# Altium schematic symbol library jlcpcb_2025_04_capacitors_extended_0402.schlib: 3594 symbols (part 14 of 20)
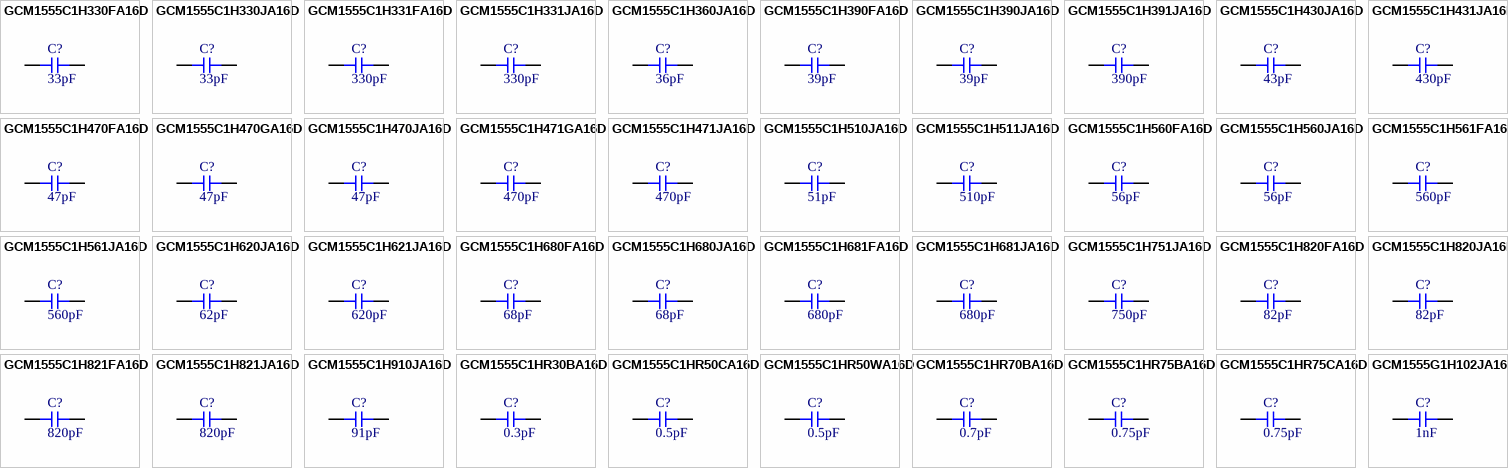
[diagram p102: symbols GCM1555C1H330FA16D to GCM1555G1H102JA16D]

## GCM1555C1H471JA16D
designator C?  Capacitance: 470pF  (hidden comment: *)
Capacitor, Ceramic (MLCC), 470pF, ±5%, 50V, C0G, ±5%, SMD 0402; Manufacturer: Murata Electronics; Manufacturer Part Number: GCM1555C1H471JA16D; Package Size: 0402; JLCPCB Basic Part: No; JLCPCB Part Number: C126512; Supplier 1: LCSC; Category: Capacitors - MLCC; Supplier Part Number 1: C126512; Tolerance: ±5%; Voltage Rating: 50V; Temperature Coefficient: C0G; RoHS: Yes; ComponentLink1Description: Datasheet; ComponentLink1URL: https://wmsc.lcsc.com/wmsc/upload/file/pdf/v2/lcsc/1811081516_Murata-Electronics-GCM1555C1H471JA16D_C126512.pdf; ComponentLink2Description: JLCPCB Part URL; ComponentLink2URL: https://jlcpcb.com/partdetail/C126512; ComponentLink3Description: LCSC Part URL; ComponentLink3URL: https://lcsc.com/product-detail/Multilayer-Ceramic-Capacitors-MLCC---SMD-SMT_Murata-Electronics-Murata-Electronics-GCM1555C1H471JA16D_C126512.html
footprint CAP-0402 (0402 (1005M) Capacitor)
pins: 1, 2

## GCM1555C1H510JA16D
designator C?  Capacitance: 51pF  (hidden comment: *)
Capacitor, Ceramic (MLCC), 51pF, ±5%, 50V, ±5%, SMD 0402; Manufacturer: Murata Electronics; Manufacturer Part Number: GCM1555C1H510JA16D; Package Size: 0402; JLCPCB Basic Part: No; JLCPCB Part Number: C2194843; Supplier 1: LCSC; Category: Capacitors - MLCC; Supplier Part Number 1: C2194843; Tolerance: ±5%; Voltage Rating: 50V; RoHS: Yes; ComponentLink1Description: Datasheet; ComponentLink1URL: https://wmsc.lcsc.com/wmsc/upload/file/pdf/v2/lcsc/2308111722_Murata-Electronics-GCM1555C1H510JA16D_C2194843.pdf; ComponentLink2Description: JLCPCB Part URL; ComponentLink2URL: https://jlcpcb.com/partdetail/C2194843; ComponentLink3Description: LCSC Part URL; ComponentLink3URL: https://lcsc.com/product-detail/Multilayer-Ceramic-Capacitors-MLCC---SMD-SMT_Murata-Electronics-Murata-Electronics-GCM1555C1H510JA16D_C2194843.html
footprint CAP-0402 (0402 (1005M) Capacitor)
pins: 1, 2

## GCM1555C1H511JA16D
designator C?  Capacitance: 510pF  (hidden comment: *)
Capacitor, Ceramic (MLCC), 510pF, 50V, C0G, SMD 0402; Manufacturer: Murata Electronics; Manufacturer Part Number: GCM1555C1H511JA16D; Package Size: 0402; JLCPCB Basic Part: No; JLCPCB Part Number: C2941935; Supplier 1: LCSC; Category: Capacitors - MLCC; Supplier Part Number 1: C2941935; Voltage Rating: 50V; Temperature Coefficient: C0G; RoHS: Yes; ComponentLink1Description: Datasheet; ComponentLink1URL: https://wmsc.lcsc.com/wmsc/upload/file/pdf/v2/lcsc/2201121900_Murata-Electronics-GCM1555C1H511JA16D_C2941935.pdf; ComponentLink2Description: JLCPCB Part URL; ComponentLink2URL: https://jlcpcb.com/partdetail/C2941935; ComponentLink3Description: LCSC Part URL; ComponentLink3URL: https://lcsc.com/product-detail/Multilayer-Ceramic-Capacitors-MLCC---SMD-SMT_Murata-Electronics-Murata-Electronics-GCM1555C1H511JA16D_C2941935.html
footprint CAP-0402 (0402 (1005M) Capacitor)
pins: 1, 2

## GCM1555C1H560FA16D
designator C?  Capacitance: 56pF  (hidden comment: *)
Capacitor, Ceramic (MLCC), 56pF, ±1%, 50V, ±1%, SMD 0402; Manufacturer: Murata Electronics; Manufacturer Part Number: GCM1555C1H560FA16D; Package Size: 0402; JLCPCB Basic Part: No; JLCPCB Part Number: C2189899; Supplier 1: LCSC; Category: Capacitors - MLCC; Supplier Part Number 1: C2189899; Tolerance: ±1%; Voltage Rating: 50V; RoHS: Yes; ComponentLink1Description: Datasheet; ComponentLink1URL: https://wmsc.lcsc.com/wmsc/upload/file/pdf/v2/lcsc/2308111721_Murata-Electronics-GCM1555C1H560FA16D_C2189899.pdf; ComponentLink2Description: JLCPCB Part URL; ComponentLink2URL: https://jlcpcb.com/partdetail/C2189899; ComponentLink3Description: LCSC Part URL; ComponentLink3URL: https://lcsc.com/product-detail/Multilayer-Ceramic-Capacitors-MLCC---SMD-SMT_Murata-Electronics-Murata-Electronics-GCM1555C1H560FA16D_C2189899.html
footprint CAP-0402 (0402 (1005M) Capacitor)
pins: 1, 2

## GCM1555C1H560JA16D
designator C?  Capacitance: 56pF  (hidden comment: *)
Capacitor, Ceramic (MLCC), 56pF, ±5%, 50V, C0G, ±5%, SMD 0402; Manufacturer: Murata Electronics; Manufacturer Part Number: GCM1555C1H560JA16D; Package Size: 0402; JLCPCB Basic Part: No; JLCPCB Part Number: C393672; Supplier 1: LCSC; Category: Capacitors - MLCC; Supplier Part Number 1: C393672; Tolerance: ±5%; Voltage Rating: 50V; Temperature Coefficient: C0G; RoHS: Yes; ComponentLink1Description: Datasheet; ComponentLink1URL: https://wmsc.lcsc.com/wmsc/upload/file/pdf/v2/lcsc/1912111437_Murata-Electronics-GCM1555C1H560JA16D_C393672.pdf; ComponentLink2Description: JLCPCB Part URL; ComponentLink2URL: https://jlcpcb.com/partdetail/C393672; ComponentLink3Description: LCSC Part URL; ComponentLink3URL: https://lcsc.com/product-detail/Multilayer-Ceramic-Capacitors-MLCC---SMD-SMT_Murata-Electronics-Murata-Electronics-GCM1555C1H560JA16D_C393672.html
footprint CAP-0402 (0402 (1005M) Capacitor)
pins: 1, 2

## GCM1555C1H561FA16D
designator C?  Capacitance: 560pF  (hidden comment: *)
Capacitor, Ceramic (MLCC), 560pF, ±1%, 50V, ±1%, SMD 0402; Manufacturer: Murata Electronics; Manufacturer Part Number: GCM1555C1H561FA16D; Package Size: 0402; JLCPCB Basic Part: No; JLCPCB Part Number: C2181330; Supplier 1: LCSC; Category: Capacitors - MLCC; Supplier Part Number 1: C2181330; Tolerance: ±1%; Voltage Rating: 50V; RoHS: Yes; ComponentLink1Description: Datasheet; ComponentLink1URL: https://wmsc.lcsc.com/wmsc/upload/file/pdf/v2/lcsc/2202041200_Murata-Electronics-GCM1555C1H561FA16D_C2181330.pdf; ComponentLink2Description: JLCPCB Part URL; ComponentLink2URL: https://jlcpcb.com/partdetail/C2181330; ComponentLink3Description: LCSC Part URL; ComponentLink3URL: https://lcsc.com/product-detail/Multilayer-Ceramic-Capacitors-MLCC---SMD-SMT_Murata-Electronics-Murata-Electronics-GCM1555C1H561FA16D_C2181330.html
footprint CAP-0402 (0402 (1005M) Capacitor)
pins: 1, 2

## GCM1555C1H561JA16D
designator C?  Capacitance: 560pF  (hidden comment: *)
Capacitor, Ceramic (MLCC), 560pF, ±5%, 50V, C0G, ±5%, SMD 0402; Manufacturer: Murata Electronics; Manufacturer Part Number: GCM1555C1H561JA16D; Package Size: 0402; JLCPCB Basic Part: No; JLCPCB Part Number: C464953; Supplier 1: LCSC; Category: Capacitors - MLCC; Supplier Part Number 1: C464953; Tolerance: ±5%; Voltage Rating: 50V; Temperature Coefficient: C0G; RoHS: Yes; ComponentLink1Description: Datasheet; ComponentLink1URL: https://wmsc.lcsc.com/wmsc/upload/file/pdf/v2/lcsc/1912111437_Murata-Electronics-GCM1555C1H561JA16D_C464953.pdf; ComponentLink2Description: JLCPCB Part URL; ComponentLink2URL: https://jlcpcb.com/partdetail/C464953; ComponentLink3Description: LCSC Part URL; ComponentLink3URL: https://lcsc.com/product-detail/Multilayer-Ceramic-Capacitors-MLCC---SMD-SMT_Murata-Electronics-Murata-Electronics-GCM1555C1H561JA16D_C464953.html
footprint CAP-0402 (0402 (1005M) Capacitor)
pins: 1, 2

## GCM1555C1H620JA16D
designator C?  Capacitance: 62pF  (hidden comment: *)
Capacitor, Ceramic (MLCC), 62pF, ±5%, 50V, C0G, ±5%, SMD 0402; Manufacturer: Murata Electronics; Manufacturer Part Number: GCM1555C1H620JA16D; Package Size: 0402; JLCPCB Basic Part: No; JLCPCB Part Number: C2941949; Supplier 1: LCSC; Category: Capacitors - MLCC; Supplier Part Number 1: C2941949; Tolerance: ±5%; Voltage Rating: 50V; Temperature Coefficient: C0G; RoHS: Yes; ComponentLink1Description: Datasheet; ComponentLink1URL: https://wmsc.lcsc.com/wmsc/upload/file/pdf/v2/lcsc/2201121900_Murata-Electronics-GCM1555C1H620JA16D_C2941949.pdf; ComponentLink2Description: JLCPCB Part URL; ComponentLink2URL: https://jlcpcb.com/partdetail/C2941949; ComponentLink3Description: LCSC Part URL; ComponentLink3URL: https://lcsc.com/product-detail/Multilayer-Ceramic-Capacitors-MLCC---SMD-SMT_Murata-Electronics-Murata-Electronics-GCM1555C1H620JA16D_C2941949.html
footprint CAP-0402 (0402 (1005M) Capacitor)
pins: 1, 2

## GCM1555C1H621JA16D
designator C?  Capacitance: 620pF  (hidden comment: *)
Capacitor, Ceramic (MLCC), 620pF, ±5%, 50V, C0G, ±5%, SMD 0402; Manufacturer: Murata Electronics; Manufacturer Part Number: GCM1555C1H621JA16D; Package Size: 0402; JLCPCB Basic Part: No; JLCPCB Part Number: C2941948; Supplier 1: LCSC; Category: Capacitors - MLCC; Supplier Part Number 1: C2941948; Tolerance: ±5%; Voltage Rating: 50V; Temperature Coefficient: C0G; RoHS: Yes; ComponentLink1Description: Datasheet; ComponentLink1URL: https://wmsc.lcsc.com/wmsc/upload/file/pdf/v2/lcsc/2201121900_Murata-Electronics-GCM1555C1H621JA16D_C2941948.pdf; ComponentLink2Description: JLCPCB Part URL; ComponentLink2URL: https://jlcpcb.com/partdetail/C2941948; ComponentLink3Description: LCSC Part URL; ComponentLink3URL: https://lcsc.com/product-detail/Multilayer-Ceramic-Capacitors-MLCC---SMD-SMT_Murata-Electronics-Murata-Electronics-GCM1555C1H621JA16D_C2941948.html
footprint CAP-0402 (0402 (1005M) Capacitor)
pins: 1, 2

## GCM1555C1H680FA16D
designator C?  Capacitance: 68pF  (hidden comment: *)
Capacitor, Ceramic (MLCC), 68pF, ±1%, 50V, C0G, ±1%, SMD 0402; Manufacturer: Murata Electronics; Manufacturer Part Number: GCM1555C1H680FA16D; Package Size: 0402; JLCPCB Basic Part: No; JLCPCB Part Number: C2987942; Supplier 1: LCSC; Category: Capacitors - MLCC; Supplier Part Number 1: C2987942; Tolerance: ±1%; Voltage Rating: 50V; Temperature Coefficient: C0G; RoHS: Yes; ComponentLink1Description: Datasheet; ComponentLink1URL: https://wmsc.lcsc.com/wmsc/upload/file/pdf/v2/lcsc/2206281801_Murata-Electronics-GCM1555C1H680FA16D_C2987942.pdf; ComponentLink2Description: JLCPCB Part URL; ComponentLink2URL: https://jlcpcb.com/partdetail/C2987942; ComponentLink3Description: LCSC Part URL; ComponentLink3URL: https://lcsc.com/product-detail/Multilayer-Ceramic-Capacitors-MLCC---SMD-SMT_Murata-Electronics-Murata-Electronics-GCM1555C1H680FA16D_C2987942.html
footprint CAP-0402 (0402 (1005M) Capacitor)
pins: 1, 2

## GCM1555C1H680JA16D
designator C?  Capacitance: 68pF  (hidden comment: *)
Capacitor, Ceramic (MLCC), 68pF, ±5%, 50V, C0G, ±5%, SMD 0402; Manufacturer: Murata Electronics; Manufacturer Part Number: GCM1555C1H680JA16D; Package Size: 0402; JLCPCB Basic Part: No; JLCPCB Part Number: C161156; Supplier 1: LCSC; Category: Capacitors - MLCC; Supplier Part Number 1: C161156; Tolerance: ±5%; Voltage Rating: 50V; Temperature Coefficient: C0G; RoHS: Yes; ComponentLink1Description: Datasheet; ComponentLink1URL: https://wmsc.lcsc.com/wmsc/upload/file/pdf/v2/lcsc/1811081550_Murata-Electronics-GCM1555C1H680JA16D_C161156.pdf; ComponentLink2Description: JLCPCB Part URL; ComponentLink2URL: https://jlcpcb.com/partdetail/C161156; ComponentLink3Description: LCSC Part URL; ComponentLink3URL: https://lcsc.com/product-detail/Multilayer-Ceramic-Capacitors-MLCC---SMD-SMT_Murata-Electronics-Murata-Electronics-GCM1555C1H680JA16D_C161156.html
footprint CAP-0402 (0402 (1005M) Capacitor)
pins: 1, 2

## GCM1555C1H681FA16D
designator C?  Capacitance: 680pF  (hidden comment: *)
Capacitor, Ceramic (MLCC), 680pF, ±1%, null, ±1%, SMD 0402; Manufacturer: Murata Electronics; Manufacturer Part Number: GCM1555C1H681FA16D; Package Size: 0402; JLCPCB Basic Part: No; JLCPCB Part Number: C882579; Supplier 1: LCSC; Category: Capacitors - MLCC; Supplier Part Number 1: C882579; Tolerance: ±1%; Voltage Rating: null; RoHS: Yes; ComponentLink1Description: Datasheet; ComponentLink1URL: https://wmsc.lcsc.com/wmsc/upload/file/pdf/v2/lcsc/2201242130_Murata-Electronics-GCM1555C1H681FA16D_C882579.pdf; ComponentLink2Description: JLCPCB Part URL; ComponentLink2URL: https://jlcpcb.com/partdetail/C882579; ComponentLink3Description: LCSC Part URL; ComponentLink3URL: https://lcsc.com/product-detail/Multilayer-Ceramic-Capacitors-MLCC---SMD-SMT_Murata-Electronics-Murata-Electronics-GCM1555C1H681FA16D_C882579.html
footprint CAP-0402 (0402 (1005M) Capacitor)
pins: 1, 2

## GCM1555C1H681JA16D
designator C?  Capacitance: 680pF  (hidden comment: *)
Capacitor, Ceramic (MLCC), 680pF, ±5%, 50V, C0G, ±5%, SMD 0402; Manufacturer: Murata Electronics; Manufacturer Part Number: GCM1555C1H681JA16D; Package Size: 0402; JLCPCB Basic Part: No; JLCPCB Part Number: C126514; Supplier 1: LCSC; Category: Capacitors - MLCC; Supplier Part Number 1: C126514; Tolerance: ±5%; Voltage Rating: 50V; Temperature Coefficient: C0G; RoHS: Yes; ComponentLink1Description: Datasheet; ComponentLink1URL: https://wmsc.lcsc.com/wmsc/upload/file/pdf/v2/lcsc/1811081510_Murata-Electronics-GCM1555C1H681JA16D_C126514.pdf; ComponentLink2Description: JLCPCB Part URL; ComponentLink2URL: https://jlcpcb.com/partdetail/C126514; ComponentLink3Description: LCSC Part URL; ComponentLink3URL: https://lcsc.com/product-detail/Multilayer-Ceramic-Capacitors-MLCC---SMD-SMT_Murata-Electronics-Murata-Electronics-GCM1555C1H681JA16D_C126514.html
footprint CAP-0402 (0402 (1005M) Capacitor)
pins: 1, 2

## GCM1555C1H751JA16D
designator C?  Capacitance: 750pF  (hidden comment: *)
Capacitor, Ceramic (MLCC), 750pF, ±5%, 50V, C0G, ±5%, SMD 0402; Manufacturer: Murata Electronics; Manufacturer Part Number: GCM1555C1H751JA16D; Package Size: 0402; JLCPCB Basic Part: No; JLCPCB Part Number: C710656; Supplier 1: LCSC; Category: Capacitors - MLCC; Supplier Part Number 1: C710656; Tolerance: ±5%; Voltage Rating: 50V; Temperature Coefficient: C0G; RoHS: Yes; ComponentLink1Description: Datasheet; ComponentLink1URL: https://wmsc.lcsc.com/wmsc/upload/file/pdf/v2/lcsc/2208111800_Murata-Electronics-GCM1555C1H751JA16D_C710656.pdf; ComponentLink2Description: JLCPCB Part URL; ComponentLink2URL: https://jlcpcb.com/partdetail/C710656; ComponentLink3Description: LCSC Part URL; ComponentLink3URL: https://lcsc.com/product-detail/Multilayer-Ceramic-Capacitors-MLCC---SMD-SMT_Murata-Electronics-Murata-Electronics-GCM1555C1H751JA16D_C710656.html
footprint CAP-0402 (0402 (1005M) Capacitor)
pins: 1, 2

## GCM1555C1H820FA16D
designator C?  Capacitance: 82pF  (hidden comment: *)
Capacitor, Ceramic (MLCC), 82pF, ±1%, 50V, ±1%, SMD 0402; Manufacturer: Murata Electronics; Manufacturer Part Number: GCM1555C1H820FA16D; Package Size: 0402; JLCPCB Basic Part: No; JLCPCB Part Number: C2169034; Supplier 1: LCSC; Category: Capacitors - MLCC; Supplier Part Number 1: C2169034; Tolerance: ±1%; Voltage Rating: 50V; RoHS: Yes; ComponentLink1Description: Datasheet; ComponentLink1URL: https://wmsc.lcsc.com/wmsc/upload/file/pdf/v2/lcsc/2202040330_Murata-Electronics-GCM1555C1H820FA16D_C2169034.pdf; ComponentLink2Description: JLCPCB Part URL; ComponentLink2URL: https://jlcpcb.com/partdetail/C2169034; ComponentLink3Description: LCSC Part URL; ComponentLink3URL: https://lcsc.com/product-detail/Multilayer-Ceramic-Capacitors-MLCC---SMD-SMT_Murata-Electronics-Murata-Electronics-GCM1555C1H820FA16D_C2169034.html
footprint CAP-0402 (0402 (1005M) Capacitor)
pins: 1, 2

## GCM1555C1H820JA16D
designator C?  Capacitance: 82pF  (hidden comment: *)
Capacitor, Ceramic (MLCC), 82pF, ±5%, 50V, C0G, ±5%, SMD 0402; Manufacturer: Murata Electronics; Manufacturer Part Number: GCM1555C1H820JA16D; Package Size: 0402; JLCPCB Basic Part: No; JLCPCB Part Number: C126515; Supplier 1: LCSC; Category: Capacitors - MLCC; Supplier Part Number 1: C126515; Tolerance: ±5%; Voltage Rating: 50V; Temperature Coefficient: C0G; RoHS: Yes; ComponentLink1Description: Datasheet; ComponentLink1URL: https://wmsc.lcsc.com/wmsc/upload/file/pdf/v2/lcsc/1811081510_Murata-Electronics-GCM1555C1H820JA16D_C126515.pdf; ComponentLink2Description: JLCPCB Part URL; ComponentLink2URL: https://jlcpcb.com/partdetail/C126515; ComponentLink3Description: LCSC Part URL; ComponentLink3URL: https://lcsc.com/product-detail/Multilayer-Ceramic-Capacitors-MLCC---SMD-SMT_Murata-Electronics-Murata-Electronics-GCM1555C1H820JA16D_C126515.html
footprint CAP-0402 (0402 (1005M) Capacitor)
pins: 1, 2

## GCM1555C1H821FA16D
designator C?  Capacitance: 820pF  (hidden comment: *)
Capacitor, Ceramic (MLCC), 820pF, ±1%, 50V, C0G, ±1%, SMD 0402; Manufacturer: Murata Electronics; Manufacturer Part Number: GCM1555C1H821FA16D; Package Size: 0402; JLCPCB Basic Part: No; JLCPCB Part Number: C1864376; Supplier 1: LCSC; Category: Capacitors - MLCC; Supplier Part Number 1: C1864376; Tolerance: ±1%; Voltage Rating: 50V; Temperature Coefficient: C0G; RoHS: Yes; ComponentLink1Description: Datasheet; ComponentLink1URL: https://wmsc.lcsc.com/wmsc/upload/file/pdf/v2/lcsc/2201271800_Murata-Electronics-GCM1555C1H821FA16D_C1864376.pdf; ComponentLink2Description: JLCPCB Part URL; ComponentLink2URL: https://jlcpcb.com/partdetail/C1864376; ComponentLink3Description: LCSC Part URL; ComponentLink3URL: https://lcsc.com/product-detail/Multilayer-Ceramic-Capacitors-MLCC---SMD-SMT_Murata-Electronics-Murata-Electronics-GCM1555C1H821FA16D_C1864376.html
footprint CAP-0402 (0402 (1005M) Capacitor)
pins: 1, 2

## GCM1555C1H821JA16D
designator C?  Capacitance: 820pF  (hidden comment: *)
Capacitor, Ceramic (MLCC), 820pF, ±5%, 50V, C0G, ±5%, SMD 0402; Manufacturer: Murata Electronics; Manufacturer Part Number: GCM1555C1H821JA16D; Package Size: 0402; JLCPCB Basic Part: No; JLCPCB Part Number: C161159; Supplier 1: LCSC; Category: Capacitors - MLCC; Supplier Part Number 1: C161159; Tolerance: ±5%; Voltage Rating: 50V; Temperature Coefficient: C0G; RoHS: Yes; ComponentLink1Description: Datasheet; ComponentLink1URL: https://wmsc.lcsc.com/wmsc/upload/file/pdf/v2/lcsc/1811081550_Murata-Electronics-GCM1555C1H821JA16D_C161159.pdf; ComponentLink2Description: JLCPCB Part URL; ComponentLink2URL: https://jlcpcb.com/partdetail/C161159; ComponentLink3Description: LCSC Part URL; ComponentLink3URL: https://lcsc.com/product-detail/Multilayer-Ceramic-Capacitors-MLCC---SMD-SMT_Murata-Electronics-Murata-Electronics-GCM1555C1H821JA16D_C161159.html
footprint CAP-0402 (0402 (1005M) Capacitor)
pins: 1, 2

## GCM1555C1H910JA16D
designator C?  Capacitance: 91pF  (hidden comment: *)
Capacitor, Ceramic (MLCC), 91pF, ±5%, 50V, ±5%, SMD 0402; Manufacturer: Murata Electronics; Manufacturer Part Number: GCM1555C1H910JA16D; Package Size: 0402; JLCPCB Basic Part: No; JLCPCB Part Number: C2194818; Supplier 1: LCSC; Category: Capacitors - MLCC; Supplier Part Number 1: C2194818; Tolerance: ±5%; Voltage Rating: 50V; RoHS: Yes; ComponentLink1Description: Datasheet; ComponentLink1URL: https://wmsc.lcsc.com/wmsc/upload/file/pdf/v2/lcsc/2308111559_Murata-Electronics-GCM1555C1H910JA16D_C2194818.pdf; ComponentLink2Description: JLCPCB Part URL; ComponentLink2URL: https://jlcpcb.com/partdetail/C2194818; ComponentLink3Description: LCSC Part URL; ComponentLink3URL: https://lcsc.com/product-detail/Multilayer-Ceramic-Capacitors-MLCC---SMD-SMT_Murata-Electronics-Murata-Electronics-GCM1555C1H910JA16D_C2194818.html
footprint CAP-0402 (0402 (1005M) Capacitor)
pins: 1, 2

## GCM1555C1HR30BA16D
designator C?  Capacitance: 0.3pF  (hidden comment: *)
Capacitor, Ceramic (MLCC), 0.3pF, 50V, SMD 0402; Manufacturer: Murata Electronics; Manufacturer Part Number: GCM1555C1HR30BA16D; Package Size: 0402; JLCPCB Basic Part: No; JLCPCB Part Number: C701169; Supplier 1: LCSC; Category: Capacitors - MLCC; Supplier Part Number 1: C701169; Voltage Rating: 50V; RoHS: Yes; ComponentLink1Description: Datasheet; ComponentLink1URL: https://wmsc.lcsc.com/wmsc/upload/file/pdf/v2/lcsc/2304140030_Murata-Electronics-GCM1555C1HR30BA16D_C701169.pdf; ComponentLink2Description: JLCPCB Part URL; ComponentLink2URL: https://jlcpcb.com/partdetail/C701169; ComponentLink3Description: LCSC Part URL; ComponentLink3URL: https://lcsc.com/product-detail/Multilayer-Ceramic-Capacitors-MLCC---SMD-SMT_Murata-Electronics-Murata-Electronics-GCM1555C1HR30BA16D_C701169.html
footprint CAP-0402 (0402 (1005M) Capacitor)
pins: 1, 2

## GCM1555C1HR50CA16D
designator C?  Capacitance: 0.5pF  (hidden comment: *)
Capacitor, Ceramic (MLCC), 0.5pF, 50V, C0G, SMD 0402; Manufacturer: Murata Electronics; Manufacturer Part Number: GCM1555C1HR50CA16D; Package Size: 0402; JLCPCB Basic Part: No; JLCPCB Part Number: C161162; Supplier 1: LCSC; Category: Capacitors - MLCC; Supplier Part Number 1: C161162; Voltage Rating: 50V; Temperature Coefficient: C0G; RoHS: Yes; ComponentLink1Description: Datasheet; ComponentLink1URL: https://wmsc.lcsc.com/wmsc/upload/file/pdf/v2/lcsc/1811081550_Murata-Electronics-GCM1555C1HR50CA16D_C161162.pdf; ComponentLink2Description: JLCPCB Part URL; ComponentLink2URL: https://jlcpcb.com/partdetail/C161162; ComponentLink3Description: LCSC Part URL; ComponentLink3URL: https://lcsc.com/product-detail/Multilayer-Ceramic-Capacitors-MLCC---SMD-SMT_Murata-Electronics-Murata-Electronics-GCM1555C1HR50CA16D_C161162.html
footprint CAP-0402 (0402 (1005M) Capacitor)
pins: 1, 2

## GCM1555C1HR50WA16D
designator C?  Capacitance: 0.5pF  (hidden comment: *)
Capacitor, Ceramic (MLCC), 0.5pF, 50V, C0G, SMD 0402; Manufacturer: Murata Electronics; Manufacturer Part Number: GCM1555C1HR50WA16D; Package Size: 0402; JLCPCB Basic Part: No; JLCPCB Part Number: C2912277; Supplier 1: LCSC; Category: Capacitors - MLCC; Supplier Part Number 1: C2912277; Voltage Rating: 50V; Temperature Coefficient: C0G; RoHS: Yes; ComponentLink1Description: Datasheet; ComponentLink1URL: https://wmsc.lcsc.com/wmsc/upload/file/pdf/v2/lcsc/2110281830_Murata-Electronics-GCM1555C1HR50WA16D_C2912277.pdf; ComponentLink2Description: JLCPCB Part URL; ComponentLink2URL: https://jlcpcb.com/partdetail/C2912277; ComponentLink3Description: LCSC Part URL; ComponentLink3URL: https://lcsc.com/product-detail/Multilayer-Ceramic-Capacitors-MLCC---SMD-SMT_Murata-Electronics-Murata-Electronics-GCM1555C1HR50WA16D_C2912277.html
footprint CAP-0402 (0402 (1005M) Capacitor)
pins: 1, 2

## GCM1555C1HR70BA16D
designator C?  Capacitance: 0.7pF  (hidden comment: *)
Capacitor, Ceramic (MLCC), 0.7pF, 50V, SMD 0402; Manufacturer: Murata Electronics; Manufacturer Part Number: GCM1555C1HR70BA16D; Package Size: 0402; JLCPCB Basic Part: No; JLCPCB Part Number: C2194394; Supplier 1: LCSC; Category: Capacitors - MLCC; Supplier Part Number 1: C2194394; Voltage Rating: 50V; RoHS: Yes; ComponentLink1Description: Datasheet; ComponentLink1URL: https://wmsc.lcsc.com/wmsc/upload/file/pdf/v2/lcsc/2308111559_Murata-Electronics-GCM1555C1HR70BA16D_C2194394.pdf; ComponentLink2Description: JLCPCB Part URL; ComponentLink2URL: https://jlcpcb.com/partdetail/C2194394; ComponentLink3Description: LCSC Part URL; ComponentLink3URL: https://lcsc.com/product-detail/Multilayer-Ceramic-Capacitors-MLCC---SMD-SMT_Murata-Electronics-Murata-Electronics-GCM1555C1HR70BA16D_C2194394.html
footprint CAP-0402 (0402 (1005M) Capacitor)
pins: 1, 2

## GCM1555C1HR75BA16D
designator C?  Capacitance: 0.75pF  (hidden comment: *)
Capacitor, Ceramic (MLCC), 0.75pF, null, SMD 0402; Manufacturer: Murata Electronics; Manufacturer Part Number: GCM1555C1HR75BA16D; Package Size: 0402; JLCPCB Basic Part: No; JLCPCB Part Number: C883552; Supplier 1: LCSC; Category: Capacitors - MLCC; Supplier Part Number 1: C883552; Voltage Rating: null; RoHS: Yes; ComponentLink1Description: Datasheet; ComponentLink1URL: https://wmsc.lcsc.com/wmsc/upload/file/pdf/v2/lcsc/2304140030_Murata-Electronics-GCM1555C1HR75BA16D_C883552.pdf; ComponentLink2Description: JLCPCB Part URL; ComponentLink2URL: https://jlcpcb.com/partdetail/C883552; ComponentLink3Description: LCSC Part URL; ComponentLink3URL: https://lcsc.com/product-detail/Multilayer-Ceramic-Capacitors-MLCC---SMD-SMT_Murata-Electronics-Murata-Electronics-GCM1555C1HR75BA16D_C883552.html
footprint CAP-0402 (0402 (1005M) Capacitor)
pins: 1, 2

## GCM1555C1HR75CA16D
designator C?  Capacitance: 0.75pF  (hidden comment: *)
Capacitor, Ceramic (MLCC), 0.75pF, 50V, C0G, SMD 0402; Manufacturer: Murata Electronics; Manufacturer Part Number: GCM1555C1HR75CA16D; Package Size: 0402; JLCPCB Basic Part: No; JLCPCB Part Number: C126520; Supplier 1: LCSC; Category: Capacitors - MLCC; Supplier Part Number 1: C126520; Voltage Rating: 50V; Temperature Coefficient: C0G; RoHS: Yes; ComponentLink1Description: Datasheet; ComponentLink1URL: https://wmsc.lcsc.com/wmsc/upload/file/pdf/v2/lcsc/1811081510_Murata-Electronics-GCM1555C1HR75CA16D_C126520.pdf; ComponentLink2Description: JLCPCB Part URL; ComponentLink2URL: https://jlcpcb.com/partdetail/C126520; ComponentLink3Description: LCSC Part URL; ComponentLink3URL: https://lcsc.com/product-detail/Multilayer-Ceramic-Capacitors-MLCC---SMD-SMT_Murata-Electronics-Murata-Electronics-GCM1555C1HR75CA16D_C126520.html
footprint CAP-0402 (0402 (1005M) Capacitor)
pins: 1, 2

## GCM1555G1H102JA16D
designator C?  Capacitance: 1nF  (hidden comment: *)
Capacitor, Ceramic (MLCC), 1nF, ±5%, null, ±5%, SMD 0402; Manufacturer: Murata Electronics; Manufacturer Part Number: GCM1555G1H102JA16D; Package Size: 0402; JLCPCB Basic Part: No; JLCPCB Part Number: C907755; Supplier 1: LCSC; Category: Capacitors - MLCC; Supplier Part Number 1: C907755; Tolerance: ±5%; Voltage Rating: null; RoHS: Yes; ComponentLink1Description: Datasheet; ComponentLink1URL: https://wmsc.lcsc.com/wmsc/upload/file/pdf/v2/lcsc/2201242100_Murata-Electronics-GCM1555G1H102JA16D_C907755.pdf; ComponentLink2Description: JLCPCB Part URL; ComponentLink2URL: https://jlcpcb.com/partdetail/C907755; ComponentLink3Description: LCSC Part URL; ComponentLink3URL: https://lcsc.com/product-detail/Multilayer-Ceramic-Capacitors-MLCC---SMD-SMT_Murata-Electronics-Murata-Electronics-GCM1555G1H102JA16D_C907755.html
footprint CAP-0402 (0402 (1005M) Capacitor)
pins: 1, 2

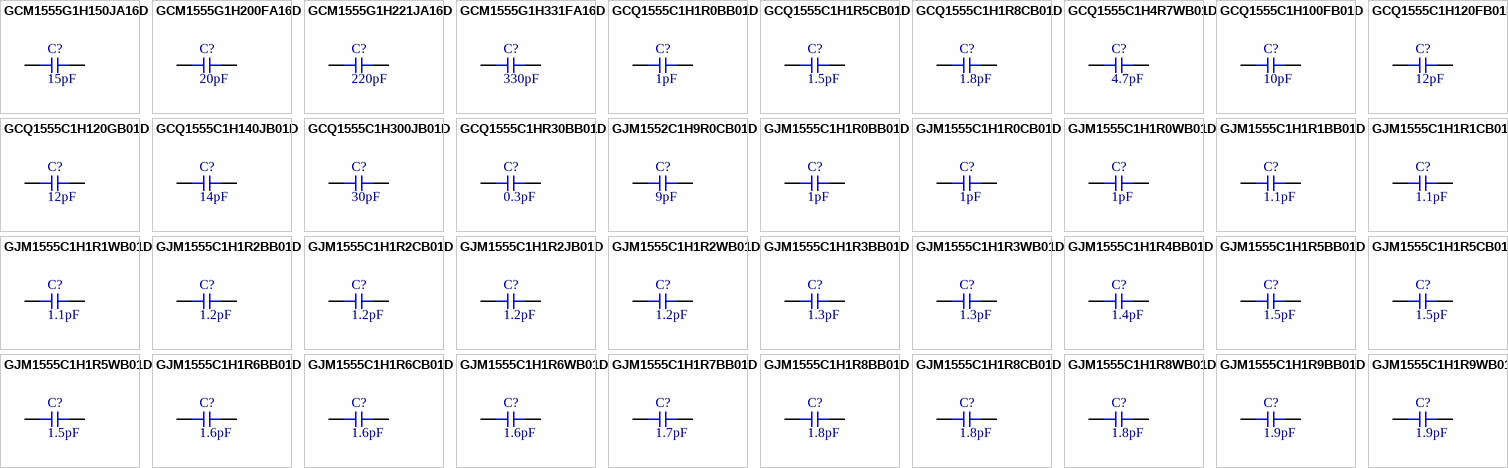
[diagram p61: symbols GCM1555G1H150JA16D to GJM1555C1H1R9WB01D]

## GCM1555G1H150JA16D
designator C?  Capacitance: 15pF  (hidden comment: *)
Capacitor, Ceramic (MLCC), 15pF, ±5%, 50V, X8G, ±5%, SMD 0402; Manufacturer: Murata Electronics; Manufacturer Part Number: GCM1555G1H150JA16D; Package Size: 0402; JLCPCB Basic Part: No; JLCPCB Part Number: C5447805; Supplier 1: LCSC; Category: Capacitors - MLCC; Supplier Part Number 1: C5447805; Tolerance: ±5%; Voltage Rating: 50V; Temperature Coefficient: X8G; RoHS: Yes; ComponentLink1Description: Datasheet; ComponentLink1URL: https://wmsc.lcsc.com/wmsc/upload/file/pdf/v2/lcsc/2304121000_Murata-Electronics-GCM1555G1H150JA16D_C5447805.pdf; ComponentLink2Description: JLCPCB Part URL; ComponentLink2URL: https://jlcpcb.com/partdetail/C5447805; ComponentLink3Description: LCSC Part URL; ComponentLink3URL: https://lcsc.com/product-detail/Multilayer-Ceramic-Capacitors-MLCC---SMD-SMT_Murata-Electronics-Murata-Electronics-GCM1555G1H150JA16D_C5447805.html
footprint CAP-0402 (0402 (1005M) Capacitor)
pins: 1, 2

## GCM1555G1H200FA16D
designator C?  Capacitance: 20pF  (hidden comment: *)
Capacitor, Ceramic (MLCC), 20pF, ±1%, 50V, X8G, ±1%, SMD 0402; Manufacturer: Murata Electronics; Manufacturer Part Number: GCM1555G1H200FA16D; Package Size: 0402; JLCPCB Basic Part: No; JLCPCB Part Number: C913469; Supplier 1: LCSC; Category: Capacitors - MLCC; Supplier Part Number 1: C913469; Tolerance: ±1%; Voltage Rating: 50V; Temperature Coefficient: X8G; RoHS: Yes; ComponentLink1Description: Datasheet; ComponentLink1URL: https://wmsc.lcsc.com/wmsc/upload/file/pdf/v2/lcsc/2201131300_Murata-Electronics-GCM1555G1H200FA16D_C913469.pdf; ComponentLink2Description: JLCPCB Part URL; ComponentLink2URL: https://jlcpcb.com/partdetail/C913469; ComponentLink3Description: LCSC Part URL; ComponentLink3URL: https://lcsc.com/product-detail/Multilayer-Ceramic-Capacitors-MLCC---SMD-SMT_Murata-Electronics-Murata-Electronics-GCM1555G1H200FA16D_C913469.html
footprint CAP-0402 (0402 (1005M) Capacitor)
pins: 1, 2

## GCM1555G1H221JA16D
designator C?  Capacitance: 220pF  (hidden comment: *)
Capacitor, Ceramic (MLCC), 220pF, ±5%, 50V, X6S, ±5%, SMD 0402; Manufacturer: Murata Electronics; Manufacturer Part Number: GCM1555G1H221JA16D; Package Size: 0402; JLCPCB Basic Part: No; JLCPCB Part Number: C1517776; Supplier 1: LCSC; Category: Capacitors - MLCC; Supplier Part Number 1: C1517776; Tolerance: ±5%; Voltage Rating: 50V; Temperature Coefficient: X6S; RoHS: Yes; ComponentLink1Description: Datasheet; ComponentLink1URL: https://wmsc.lcsc.com/wmsc/upload/file/pdf/v2/lcsc/2108201930_Murata-Electronics-GCM1555G1H221JA16D_C1517776.pdf; ComponentLink2Description: JLCPCB Part URL; ComponentLink2URL: https://jlcpcb.com/partdetail/C1517776; ComponentLink3Description: LCSC Part URL; ComponentLink3URL: https://lcsc.com/product-detail/Multilayer-Ceramic-Capacitors-MLCC---SMD-SMT_Murata-Electronics-Murata-Electronics-GCM1555G1H221JA16D_C1517776.html
footprint CAP-0402 (0402 (1005M) Capacitor)
pins: 1, 2

## GCM1555G1H331FA16D
designator C?  Capacitance: 330pF  (hidden comment: *)
Capacitor, Ceramic (MLCC), 330pF, ±1%, ±1%, SMD 0402; Manufacturer: Murata Electronics; Manufacturer Part Number: GCM1555G1H331FA16D; Package Size: 0402; JLCPCB Basic Part: No; JLCPCB Part Number: C907731; Supplier 1: LCSC; Category: Capacitors - MLCC; Supplier Part Number 1: C907731; Tolerance: ±1%; RoHS: Yes; ComponentLink1Description: Datasheet; ComponentLink1URL: https://wmsc.lcsc.com/wmsc/upload/file/pdf/v2/lcsc/2201242100_Murata-Electronics-GCM1555G1H331FA16D_C907731.pdf; ComponentLink2Description: JLCPCB Part URL; ComponentLink2URL: https://jlcpcb.com/partdetail/C907731; ComponentLink3Description: LCSC Part URL; ComponentLink3URL: https://lcsc.com/product-detail/Multilayer-Ceramic-Capacitors-MLCC---SMD-SMT_Murata-Electronics-Murata-Electronics-GCM1555G1H331FA16D_C907731.html
footprint CAP-0402 (0402 (1005M) Capacitor)
pins: 1, 2

## GCQ1555C1H1R0BB01D
designator C?  Capacitance: 1pF  (hidden comment: *)
Capacitor, Ceramic (MLCC), 1pF, 50V, SMD 0402; Manufacturer: Murata Electronics; Manufacturer Part Number: GCQ1555C1H1R0BB01D; Package Size: 0402; JLCPCB Basic Part: No; JLCPCB Part Number: C2227234; Supplier 1: LCSC; Category: Capacitors - MLCC; Supplier Part Number 1: C2227234; Voltage Rating: 50V; RoHS: Yes; ComponentLink1Description: Datasheet; ComponentLink1URL: https://wmsc.lcsc.com/wmsc/upload/file/pdf/v2/lcsc/2104171205_Murata-Electronics-GCQ1555C1H1R0BB01D_C2227234.pdf; ComponentLink2Description: JLCPCB Part URL; ComponentLink2URL: https://jlcpcb.com/partdetail/C2227234; ComponentLink3Description: LCSC Part URL; ComponentLink3URL: https://lcsc.com/product-detail/Multilayer-Ceramic-Capacitors-MLCC---SMD-SMT_Murata-Electronics-Murata-Electronics-GCQ1555C1H1R0BB01D_C2227234.html
footprint CAP-0402 (0402 (1005M) Capacitor)
pins: 1, 2

## GCQ1555C1H1R5CB01D
designator C?  Capacitance: 1.5pF  (hidden comment: *)
Capacitor, Ceramic (MLCC), 1.5pF, null, SMD 0402; Manufacturer: Murata Electronics; Manufacturer Part Number: GCQ1555C1H1R5CB01D; Package Size: 0402; JLCPCB Basic Part: No; JLCPCB Part Number: C883568; Supplier 1: LCSC; Category: Capacitors - MLCC; Supplier Part Number 1: C883568; Voltage Rating: null; RoHS: Yes; ComponentLink1Description: Datasheet; ComponentLink1URL: https://wmsc.lcsc.com/wmsc/upload/file/pdf/v2/lcsc/2304140030_Murata-Electronics-GCQ1555C1H1R5CB01D_C883568.pdf; ComponentLink2Description: JLCPCB Part URL; ComponentLink2URL: https://jlcpcb.com/partdetail/C883568; ComponentLink3Description: LCSC Part URL; ComponentLink3URL: https://lcsc.com/product-detail/Multilayer-Ceramic-Capacitors-MLCC---SMD-SMT_Murata-Electronics-Murata-Electronics-GCQ1555C1H1R5CB01D_C883568.html
footprint CAP-0402 (0402 (1005M) Capacitor)
pins: 1, 2

## GCQ1555C1H1R8CB01D
designator C?  Capacitance: 1.8pF  (hidden comment: *)
Capacitor, Ceramic (MLCC), 1.8pF, null, SMD 0402; Manufacturer: Murata Electronics; Manufacturer Part Number: GCQ1555C1H1R8CB01D; Package Size: 0402; JLCPCB Basic Part: No; JLCPCB Part Number: C883559; Supplier 1: LCSC; Category: Capacitors - MLCC; Supplier Part Number 1: C883559; Voltage Rating: null; RoHS: Yes; ComponentLink1Description: Datasheet; ComponentLink1URL: https://wmsc.lcsc.com/wmsc/upload/file/pdf/v2/lcsc/2304140030_Murata-Electronics-GCQ1555C1H1R8CB01D_C883559.pdf; ComponentLink2Description: JLCPCB Part URL; ComponentLink2URL: https://jlcpcb.com/partdetail/C883559; ComponentLink3Description: LCSC Part URL; ComponentLink3URL: https://lcsc.com/product-detail/Multilayer-Ceramic-Capacitors-MLCC---SMD-SMT_Murata-Electronics-Murata-Electronics-GCQ1555C1H1R8CB01D_C883559.html
footprint CAP-0402 (0402 (1005M) Capacitor)
pins: 1, 2

## GCQ1555C1H4R7WB01D
designator C?  Capacitance: 4.7pF  (hidden comment: *)
Capacitor, Ceramic (MLCC), 4.7pF, 50V, C0G, SMD 0402; Manufacturer: Murata Electronics; Manufacturer Part Number: GCQ1555C1H4R7WB01D; Package Size: 0402; JLCPCB Basic Part: No; JLCPCB Part Number: C3862434; Supplier 1: LCSC; Category: Capacitors - MLCC; Supplier Part Number 1: C3862434; Voltage Rating: 50V; Temperature Coefficient: C0G; RoHS: Yes; ComponentLink1Description: Datasheet; ComponentLink1URL: https://wmsc.lcsc.com/wmsc/upload/file/pdf/v2/lcsc/2308111751_Murata-Electronics-GCQ1555C1H4R7WB01D_C3862434.pdf; ComponentLink2Description: JLCPCB Part URL; ComponentLink2URL: https://jlcpcb.com/partdetail/C3862434; ComponentLink3Description: LCSC Part URL; ComponentLink3URL: https://lcsc.com/product-detail/Multilayer-Ceramic-Capacitors-MLCC---SMD-SMT_Murata-Electronics-Murata-Electronics-GCQ1555C1H4R7WB01D_C3862434.html
footprint CAP-0402 (0402 (1005M) Capacitor)
pins: 1, 2

## GCQ1555C1H100FB01D
designator C?  Capacitance: 10pF  (hidden comment: *)
Capacitor, Ceramic (MLCC), 10pF, ±1%, 50V, ±1%, SMD 0402; Manufacturer: Murata Electronics; Manufacturer Part Number: GCQ1555C1H100FB01D; Package Size: 0402; JLCPCB Basic Part: No; JLCPCB Part Number: C2250755; Supplier 1: LCSC; Category: Capacitors - MLCC; Supplier Part Number 1: C2250755; Tolerance: ±1%; Voltage Rating: 50V; RoHS: Yes; ComponentLink1Description: Datasheet; ComponentLink1URL: https://wmsc.lcsc.com/wmsc/upload/file/pdf/v2/lcsc/2104181006_Murata-Electronics-GCQ1555C1H100FB01D_C2250755.pdf; ComponentLink2Description: JLCPCB Part URL; ComponentLink2URL: https://jlcpcb.com/partdetail/C2250755; ComponentLink3Description: LCSC Part URL; ComponentLink3URL: https://lcsc.com/product-detail/Multilayer-Ceramic-Capacitors-MLCC---SMD-SMT_Murata-Electronics-Murata-Electronics-GCQ1555C1H100FB01D_C2250755.html
footprint CAP-0402 (0402 (1005M) Capacitor)
pins: 1, 2

## GCQ1555C1H120FB01D
designator C?  Capacitance: 12pF  (hidden comment: *)
Capacitor, Ceramic (MLCC), 12pF, ±1%, 50V, ±1%, SMD 0402; Manufacturer: Murata Electronics; Manufacturer Part Number: GCQ1555C1H120FB01D; Package Size: 0402; JLCPCB Basic Part: No; JLCPCB Part Number: C2250738; Supplier 1: LCSC; Category: Capacitors - MLCC; Supplier Part Number 1: C2250738; Tolerance: ±1%; Voltage Rating: 50V; RoHS: Yes; ComponentLink1Description: Datasheet; ComponentLink1URL: https://wmsc.lcsc.com/wmsc/upload/file/pdf/v2/lcsc/2108060330_Murata-Electronics-GCQ1555C1H120FB01D_C2250738.pdf; ComponentLink2Description: JLCPCB Part URL; ComponentLink2URL: https://jlcpcb.com/partdetail/C2250738; ComponentLink3Description: LCSC Part URL; ComponentLink3URL: https://lcsc.com/product-detail/Multilayer-Ceramic-Capacitors-MLCC---SMD-SMT_Murata-Electronics-Murata-Electronics-GCQ1555C1H120FB01D_C2250738.html
footprint CAP-0402 (0402 (1005M) Capacitor)
pins: 1, 2

## GCQ1555C1H120GB01D
designator C?  Capacitance: 12pF  (hidden comment: *)
Capacitor, Ceramic (MLCC), 12pF, ±2%, 50V, ±2%, SMD 0402; Manufacturer: Murata Electronics; Manufacturer Part Number: GCQ1555C1H120GB01D; Package Size: 0402; JLCPCB Basic Part: No; JLCPCB Part Number: C2235030; Supplier 1: LCSC; Category: Capacitors - MLCC; Supplier Part Number 1: C2235030; Tolerance: ±2%; Voltage Rating: 50V; RoHS: Yes; ComponentLink1Description: Datasheet; ComponentLink1URL: https://wmsc.lcsc.com/wmsc/upload/file/pdf/v2/lcsc/2202052130_Murata-Electronics-GCQ1555C1H120GB01D_C2235030.pdf; ComponentLink2Description: JLCPCB Part URL; ComponentLink2URL: https://jlcpcb.com/partdetail/C2235030; ComponentLink3Description: LCSC Part URL; ComponentLink3URL: https://lcsc.com/product-detail/Multilayer-Ceramic-Capacitors-MLCC---SMD-SMT_Murata-Electronics-Murata-Electronics-GCQ1555C1H120GB01D_C2235030.html
footprint CAP-0402 (0402 (1005M) Capacitor)
pins: 1, 2

## GCQ1555C1H140JB01D
designator C?  Capacitance: 14pF  (hidden comment: *)
Capacitor, Ceramic (MLCC), 14pF, ±5%, 50V, ±5%, SMD 0402; Manufacturer: Murata Electronics; Manufacturer Part Number: GCQ1555C1H140JB01D; Package Size: 0402; JLCPCB Basic Part: No; JLCPCB Part Number: C2179141; Supplier 1: LCSC; Category: Capacitors - MLCC; Supplier Part Number 1: C2179141; Tolerance: ±5%; Voltage Rating: 50V; RoHS: Yes; ComponentLink1Description: Datasheet; ComponentLink1URL: https://wmsc.lcsc.com/wmsc/upload/file/pdf/v2/lcsc/2202041030_Murata-Electronics-GCQ1555C1H140JB01D_C2179141.pdf; ComponentLink2Description: JLCPCB Part URL; ComponentLink2URL: https://jlcpcb.com/partdetail/C2179141; ComponentLink3Description: LCSC Part URL; ComponentLink3URL: https://lcsc.com/product-detail/Multilayer-Ceramic-Capacitors-MLCC---SMD-SMT_Murata-Electronics-Murata-Electronics-GCQ1555C1H140JB01D_C2179141.html
footprint CAP-0402 (0402 (1005M) Capacitor)
pins: 1, 2

## GCQ1555C1H300JB01D
designator C?  Capacitance: 30pF  (hidden comment: *)
Capacitor, Ceramic (MLCC), 30pF, ±5%, 50V, ±5%, SMD 0402; Manufacturer: Murata Electronics; Manufacturer Part Number: GCQ1555C1H300JB01D; Package Size: 0402; JLCPCB Basic Part: No; JLCPCB Part Number: C2186903; Supplier 1: LCSC; Category: Capacitors - MLCC; Supplier Part Number 1: C2186903; Tolerance: ±5%; Voltage Rating: 50V; RoHS: Yes; ComponentLink1Description: Datasheet; ComponentLink1URL: https://wmsc.lcsc.com/wmsc/upload/file/pdf/v2/lcsc/2202041630_Murata-Electronics-GCQ1555C1H300JB01D_C2186903.pdf; ComponentLink2Description: JLCPCB Part URL; ComponentLink2URL: https://jlcpcb.com/partdetail/C2186903; ComponentLink3Description: LCSC Part URL; ComponentLink3URL: https://lcsc.com/product-detail/Multilayer-Ceramic-Capacitors-MLCC---SMD-SMT_Murata-Electronics-Murata-Electronics-GCQ1555C1H300JB01D_C2186903.html
footprint CAP-0402 (0402 (1005M) Capacitor)
pins: 1, 2

## GCQ1555C1HR30BB01D
designator C?  Capacitance: 0.3pF  (hidden comment: *)
Capacitor, Ceramic (MLCC), 0.3pF, 50V, C0G, SMD 0402; Manufacturer: Murata Electronics; Manufacturer Part Number: GCQ1555C1HR30BB01D; Package Size: 0402; JLCPCB Basic Part: No; JLCPCB Part Number: C2986289; Supplier 1: LCSC; Category: Capacitors - MLCC; Supplier Part Number 1: C2986289; Voltage Rating: 50V; Temperature Coefficient: C0G; RoHS: Yes; ComponentLink1Description: Datasheet; ComponentLink1URL: https://wmsc.lcsc.com/wmsc/upload/file/pdf/v2/lcsc/2204251600_Murata-Electronics-GCQ1555C1HR30BB01D_C2986289.pdf; ComponentLink2Description: JLCPCB Part URL; ComponentLink2URL: https://jlcpcb.com/partdetail/C2986289; ComponentLink3Description: LCSC Part URL; ComponentLink3URL: https://lcsc.com/product-detail/Multilayer-Ceramic-Capacitors-MLCC---SMD-SMT_Murata-Electronics-Murata-Electronics-GCQ1555C1HR30BB01D_C2986289.html
footprint CAP-0402 (0402 (1005M) Capacitor)
pins: 1, 2

## GJM1552C1H9R0CB01D
designator C?  Capacitance: 9pF  (hidden comment: *)
Capacitor, Ceramic (MLCC), 9pF, 50V, CH, SMD 0402; Manufacturer: Murata Electronics; Manufacturer Part Number: GJM1552C1H9R0CB01D; Package Size: 0402; JLCPCB Basic Part: No; JLCPCB Part Number: C237311; Supplier 1: LCSC; Category: Capacitors - MLCC; Supplier Part Number 1: C237311; Voltage Rating: 50V; Temperature Coefficient: CH; RoHS: Yes; ComponentLink1Description: Datasheet; ComponentLink1URL: https://wmsc.lcsc.com/wmsc/upload/file/pdf/v2/lcsc/1912111437_Murata-Electronics-GJM1552C1H9R0CB01D_C237311.pdf; ComponentLink2Description: JLCPCB Part URL; ComponentLink2URL: https://jlcpcb.com/partdetail/C237311; ComponentLink3Description: LCSC Part URL; ComponentLink3URL: https://lcsc.com/product-detail/Multilayer-Ceramic-Capacitors-MLCC---SMD-SMT_Murata-Electronics-Murata-Electronics-GJM1552C1H9R0CB01D_C237311.html
footprint CAP-0402 (0402 (1005M) Capacitor)
pins: 1, 2

## GJM1555C1H1R0BB01D
designator C?  Capacitance: 1pF  (hidden comment: *)
Capacitor, Ceramic (MLCC), 1pF, 50V, C0G, SMD 0402; Manufacturer: Murata Electronics; Manufacturer Part Number: GJM1555C1H1R0BB01D; Package Size: 0402; JLCPCB Basic Part: No; JLCPCB Part Number: C76898; Supplier 1: LCSC; Category: Capacitors - MLCC; Supplier Part Number 1: C76898; Voltage Rating: 50V; Temperature Coefficient: C0G; RoHS: Yes; ComponentLink1Description: Datasheet; ComponentLink1URL: https://wmsc.lcsc.com/wmsc/upload/file/pdf/v2/lcsc/1811081611_Murata-Electronics-GJM1555C1H1R0BB01D_C76898.pdf; ComponentLink2Description: JLCPCB Part URL; ComponentLink2URL: https://jlcpcb.com/partdetail/C76898; ComponentLink3Description: LCSC Part URL; ComponentLink3URL: https://lcsc.com/product-detail/Multilayer-Ceramic-Capacitors-MLCC---SMD-SMT_Murata-Electronics-Murata-Electronics-GJM1555C1H1R0BB01D_C76898.html
footprint CAP-0402 (0402 (1005M) Capacitor)
pins: 1, 2

## GJM1555C1H1R0CB01D
designator C?  Capacitance: 1pF  (hidden comment: *)
Capacitor, Ceramic (MLCC), 1pF, 50V, C0G, SMD 0402; Manufacturer: Murata Electronics; Manufacturer Part Number: GJM1555C1H1R0CB01D; Package Size: 0402; JLCPCB Basic Part: No; JLCPCB Part Number: C85876; Supplier 1: LCSC; Category: Capacitors - MLCC; Supplier Part Number 1: C85876; Voltage Rating: 50V; Temperature Coefficient: C0G; RoHS: Yes; ComponentLink1Description: Datasheet; ComponentLink1URL: https://wmsc.lcsc.com/wmsc/upload/file/pdf/v2/lcsc/2304140030_Murata-Electronics-GJM1555C1H1R0CB01D_C85876.pdf; ComponentLink2Description: JLCPCB Part URL; ComponentLink2URL: https://jlcpcb.com/partdetail/C85876; ComponentLink3Description: LCSC Part URL; ComponentLink3URL: https://lcsc.com/product-detail/Multilayer-Ceramic-Capacitors-MLCC---SMD-SMT_Murata-Electronics-Murata-Electronics-GJM1555C1H1R0CB01D_C85876.html
footprint CAP-0402 (0402 (1005M) Capacitor)
pins: 1, 2
